# Altium footprint library Miscellaneous Connectors.PcbLib: 248 footprints (part 16 of 16)
Each footprint in its own frame and in the unit in brackets; x right, y up, seen from the top. Pads: shape width x height; smd on the part's side, far side on the other; paste and mask are expansions set on the pad; w line width, h text height; cw(c..) or ccw(c..) is an arc to the next point about the centre after c.
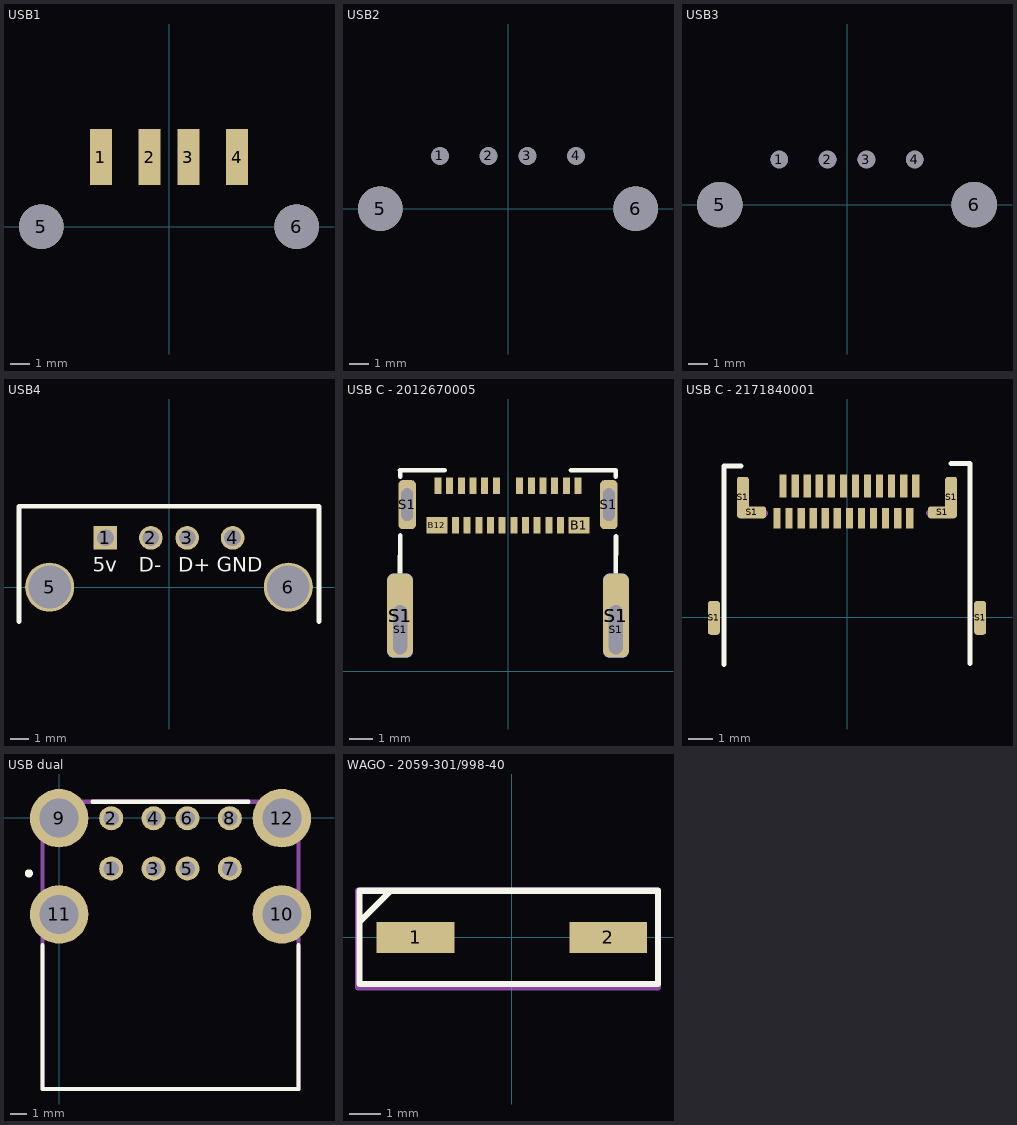
[diagram p15: the footprints below, top view; thin cyan lines are the x and y axes]

## USB1 [mm]
pads (6):
  rect 1.12x2.88 smd: 1(-3.5,3.58) 2(-1,3.58) 3(1,3.58) 4(3.5,3.58)
  round 2.3 hole 2.3: 5(-6.57,0) 6(6.57,0)
3D body "USB Connector1.STEP": height 7.95, standoff -3.19, extent -8.387,-10.719 8.387,4.8

## USB2 [mm]
pads (6):
  round 0.9 hole 0.92: 1(-3.5,2.71) 2(-1,2.71) 3(1,2.71) 4(3.5,2.71)
  round 2.3 hole 2.3: 5(-6.57,0) 6(6.57,0)
3D body "USB Connector2.stp": height 7.75, standoff -3.75, extent -7.8,-10.4 7.8,3.8

## USB3 [mm] "3.0; Type A; serie MUSBR; IP67; pines horizontales"
pads (6):
  round 0.9 hole 0.92: 1(-3.5,2.33) 2(-1,2.33) 3(1,2.33) 4(3.5,2.33)
  round 2.35 hole 2.35: 5(-6.57,0) 6(6.57,0)
3D body "USB-IP67.step": height 14, standoff -4, extent -15,-11.7 15,4.5

## USB4 [mm] "3.0; Type A; serie MUSBR; IP67; pines verticales"
pads (6):
  rect 1.3x1.3 hole 0.92: 1(-3.5,2.71)
  round 1.3 hole 0.92: 2(-1,2.71) 3(1,2.71) 4(3.5,2.71)
  round 2.7 hole 2.35: 5(-6.57,0) 6(6.57,0)
Top Overlay:
  lines w0.254: -8.255,-1.905 -8.255,4.445 8.255,4.445 8.255,-1.905
  text "GND" at 2.62,0.835 h0.8
  text "D+" at 0.499,0.835 h0.8
  text "D-" at -1.66,0.835 h0.8
  text "5v" at -4.2,0.835 h0.8
3D body "USB-IP67-pines verticales.STEP": height 16.3, standoff -3.2, extent -15,-7.5 15,10.5

## USB C - 2012670005 [mm] "24pins - Type C"
pads (32):
  rect 0.3x0.7 smd: A1(-3,7.94) A2(-2.5,7.94) A3(-2,7.94) A4(-1.5,7.94) A5(-1,7.94) A6(-0.5,7.94) A7(0.5,7.94) A8(1,7.94) A9(1.5,7.94) A10(2,7.94) A11(2.5,7.94) A12(3,7.94) B2(2.25,6.24) B3(1.75,6.24) B4(1.25,6.24) B5(0.75,6.24) B6(0.25,6.24) B7(-0.25,6.24) B8(-0.75,6.24) B9(-1.25,6.24) B10(-1.75,6.24) B11(-2.25,6.24)
  rect 0.9x0.7 smd: B1(3.05,6.24) B12(-3.05,6.24)
  rrect50% 1.1x3.6 smd mask+0.25: S1(-4.625,2.375) S1(4.625,2.375)
  rrect50% 1.1x3.6 smd far side mask+0.25: S1(-4.625,2.375) S1(4.625,2.375)
  rrect50% 0.6x2.1 hole 2.1 slot 0.6 at 0 deg mask+0.25: S1(-4.621,1.77) S1(4.621,1.77)
  rrect50% 0.75x2.1 hole 1.4 slot 0.5 at 0 deg mask+0.25: S1(-4.32,7.13) S1(4.32,7.13)
Top Overlay:
  lines w0.2: -4.625,4.15 -4.62,5.805 ; -4.625,8.6 -2.705,8.6 ; -4.62,8.33 -4.62,8.6 ; 2.7,8.6 4.62,8.6 4.62,8.33 ; 4.62,4.12 4.625,5.775
3D body "USB type C 24pins - 2012670005.stp": height 3.67, standoff -2.34, extent -4.695,-0.22 4.695,8.08

## USB C - 2171840001 [mm] "24pins - type C"
pads (30):
  rect 0.3x0.95 smd: A1(-2.65,5.45) A2(-2.15,5.45) A3(-1.65,5.45) A4(-1.15,5.45) A5(-0.65,5.45) A6(-0.15,5.45) A7(0.35,5.45) A8(0.85,5.45) A9(1.35,5.45) A10(1.85,5.45) A11(2.35,5.45) A12(2.85,5.45)
  rect 0.3x0.85 smd: B1(2.6,4.1) B2(2.1,4.1) B3(1.6,4.1) B4(1.1,4.1) B5(0.6,4.1) B6(0.1,4.1) B7(-0.4,4.1) B8(-0.9,4.1) B9(-1.4,4.1) B10(-1.9,4.1) B11(-2.4,4.1) B12(-2.9,4.1)
  rrect50% 0.5x1.4 all layers, no hole: S1(-5.52,-0.025) S1(5.52,-0.025)
  rrect50% 0.5x1.7 all layers, no hole: S1(-4.32,4.975) S1(4.32,4.975)
  rrect50% 1.2x0.5 all layers, no hole: S1(-3.95,4.35) S1(3.95,4.35)
Top Overlay:
  lines w0.2: -5.1,-1.955 -5.1,6.275 -4.4,6.275 ; 4.3,6.375 5.1,6.375 5.1,-1.925
Route Tool Path:
  lines w0.3: -5.52,-0.525 -5.52,0.475 ; -4.32,5.615 -4.32,4.315 -3.42,4.315 ; 3.42,4.325 4.32,4.325 4.32,5.625 ; 5.52,-0.525 5.52,0.475
3D body "USB type C 24pins - 2171840001.stp": height 2.33, standoff -0.83, extent -5.67,-2.365 5.67,5.735

## USB dual [mm]
pads (12):
  round 1.42 hole 0.92: 1(3.07,-2.995) 2(3.07,-0.025) 3(5.57,-2.995) 4(5.57,-0.025) 5(7.57,-2.995) 6(7.57,-0.025) 7(10.07,-2.995) 8(10.07,-0.025)
  round 3.45 hole 2.3: 9(0,-0.025) 10(13.14,-5.705) 11(0,-5.705) 12(13.14,-0.025)
Top Overlay:
  circle w0.254: c-1.787,-3.278 r0.114
  lines w0.254: -0.98,-7.53 -0.98,-16.005 14.12,-16.005 14.12,-7.53 ; 1.97,0.945 11.17,0.945
Mechanical 13:
  lines w0.254: -0.98,-16.005 14.12,-16.005 14.12,0.945 -0.98,0.945 -0.98,-16.005
3D body "USB Dual - UJ2-ADH-1-TH.stp": height 15.6, standoff -3.8, extent -1.35,-16.573 14.35,1.025

## WAGO - 2059-301/998-40 [mm] "fabricante WAGO"
pads (2):
  rect 2.5x1 smd: 1(-3.1,0) 2(3.1,0)
Top Overlay:
  lines w0.2: -4.9,0.5 -3.963,1.437 ; -4.9,-1.5 -4.9,1.5 4.7,1.5 4.7,-1.5 -4.9,-1.5
Mechanical 15:
  lines w0.2: -4.95,-1.6 4.7,-1.6 4.7,1.5 -4.95,1.5 -4.95,-1.6
3D body "conector WAGO 2059-301_998-403.stp": height 2.75, standoff 0.05, extent -4.025,-1.4 3.825,1.5